# Altium schematic symbol library jlcpcb_2025_04_resistors_extended_0201.schlib: 1508 symbols (part 3 of 8) (continued)
## NQ01WMF3300TEE
designator R?  Resistance: 330Ω  (hidden comment: *)
Resistor, 330Ω, ±1%, 50mW, ±200ppm/℃, SMD 0201; Manufacturer: Uniroyal; Manufacturer Part Number: NQ01WMF3300TEE; Supplier 1: LCSC; Supplier Part Number 1: C965372; JLCPCB Part Number: C965372; Power Rating: 50mW; Category: Resistors; Package Size: 0201; JLCPCB Basic Part: Yes; Tolerance: ±1%; Temperature Coefficient: ±200ppm/℃; ComponentLink1Description: Datasheet; ComponentLink1URL: https://wmsc.lcsc.com/wmsc/upload/file/pdf/v2/lcsc/2304140030_UNI-ROYAL-Uniroyal-Elec-NQ01WMF3300TEE_C965372.pdf; ComponentLink2Description: JLCPCB Part URL; ComponentLink2URL: https://jlcpcb.com/partdetail/C965372
pins: 1, 2
1 alternate drawing of the same symbol

## NQ01WMF3301TEE
designator R?  Resistance: 3.3kΩ  (hidden comment: *)
Resistor, 3.3kΩ, ±1%, 50mW, 50V, ±200ppm/℃, -55℃~+155℃, SMD 0201; Manufacturer: Uniroyal; Manufacturer Part Number: NQ01WMF3301TEE; Supplier 1: LCSC; Supplier Part Number 1: C965371; JLCPCB Part Number: C965371; Power Rating: 50mW; Category: Resistors; Package Size: 0201; JLCPCB Basic Part: Yes; Tolerance: ±1%; Voltage Rating: 50V; Temperature Coefficient: ±200ppm/℃; Temperature Rating: -55℃~+155℃; ComponentLink1Description: Datasheet; ComponentLink1URL: https://wmsc.lcsc.com/wmsc/upload/file/pdf/v2/lcsc/2304140030_UNI-ROYAL-Uniroyal-Elec-NQ01WMF3301TEE_C965371.pdf; ComponentLink2Description: JLCPCB Part URL; ComponentLink2URL: https://jlcpcb.com/partdetail/C965371
pins: 1, 2
1 alternate drawing of the same symbol

## NQ01WMF3401TEE
designator R?  Resistance: 3.4kΩ  (hidden comment: *)
Resistor, 3.4kΩ, ±1%, 50mW, 50V, ±200ppm/℃, -55℃~+155℃, SMD 0201; Manufacturer: Uniroyal; Manufacturer Part Number: NQ01WMF3401TEE; Supplier 1: LCSC; Supplier Part Number 1: C965370; JLCPCB Part Number: C965370; Power Rating: 50mW; Category: Resistors; Package Size: 0201; JLCPCB Basic Part: Yes; Tolerance: ±1%; Voltage Rating: 50V; Temperature Coefficient: ±200ppm/℃; Temperature Rating: -55℃~+155℃; ComponentLink1Description: Datasheet; ComponentLink1URL: https://wmsc.lcsc.com/wmsc/upload/file/pdf/v2/lcsc/2304140030_UNI-ROYAL-Uniroyal-Elec-NQ01WMF3401TEE_C965370.pdf; ComponentLink2Description: JLCPCB Part URL; ComponentLink2URL: https://jlcpcb.com/partdetail/C965370
pins: 1, 2
1 alternate drawing of the same symbol

## NQ01WMF3601TEE
designator R?  Resistance: 3.6kΩ  (hidden comment: *)
Resistor, 3.6kΩ, ±1%, 50mW, ±200ppm/℃, SMD 0201; Manufacturer: Uniroyal; Manufacturer Part Number: NQ01WMF3601TEE; Supplier 1: LCSC; Supplier Part Number 1: C965369; JLCPCB Part Number: C965369; Power Rating: 50mW; Category: Resistors; Package Size: 0201; JLCPCB Basic Part: Yes; Tolerance: ±1%; Temperature Coefficient: ±200ppm/℃; ComponentLink1Description: Datasheet; ComponentLink1URL: https://wmsc.lcsc.com/wmsc/upload/file/pdf/v2/lcsc/2304140030_UNI-ROYAL-Uniroyal-Elec-NQ01WMF3601TEE_C965369.pdf; ComponentLink2Description: JLCPCB Part URL; ComponentLink2URL: https://jlcpcb.com/partdetail/C965369
pins: 1, 2
1 alternate drawing of the same symbol

## NQ01WMF4021TEE
designator R?  Resistance: 4.02kΩ  (hidden comment: *)
Resistor, 4.02kΩ, ±1%, 50mW, ±200ppm/℃, SMD 0201; Manufacturer: Uniroyal; Manufacturer Part Number: NQ01WMF4021TEE; Supplier 1: LCSC; Supplier Part Number 1: C965365; JLCPCB Part Number: C965365; Power Rating: 50mW; Category: Resistors; Package Size: 0201; JLCPCB Basic Part: Yes; Tolerance: ±1%; Temperature Coefficient: ±200ppm/℃; ComponentLink1Description: Datasheet; ComponentLink1URL: https://wmsc.lcsc.com/wmsc/upload/file/pdf/v2/lcsc/2304140030_UNI-ROYAL-Uniroyal-Elec-NQ01WMF4021TEE_C965365.pdf; ComponentLink2Description: JLCPCB Part URL; ComponentLink2URL: https://jlcpcb.com/partdetail/C965365
pins: 1, 2
1 alternate drawing of the same symbol

## NQ01WMF4992TEE
designator R?  Resistance: 49.9kΩ  (hidden comment: *)
Resistor, 49.9kΩ, ±1%, 50mW, 50V, -55℃~+155℃, SMD 0201; Manufacturer: Uniroyal; Manufacturer Part Number: NQ01WMF4992TEE; Supplier 1: LCSC; Supplier Part Number 1: C2758764; JLCPCB Part Number: C2758764; Power Rating: 50mW; Category: Resistors; Package Size: 0201; JLCPCB Basic Part: Yes; Tolerance: ±1%; Voltage Rating: 50V; Temperature Rating: -55℃~+155℃; ComponentLink1Description: Datasheet; ComponentLink1URL: https://wmsc.lcsc.com/wmsc/upload/file/pdf/v2/lcsc/2304140030_UNI-ROYAL-Uniroyal-Elec-NQ01WMF4992TEE_C2758764.pdf; ComponentLink2Description: JLCPCB Part URL; ComponentLink2URL: https://jlcpcb.com/partdetail/C2758764
pins: 1, 2
1 alternate drawing of the same symbol

## NQ01WMF4993TEE
designator R?  Resistance: 499kΩ  (hidden comment: *)
Resistor, 499kΩ, ±1%, 50mW, ±200ppm/℃, SMD 0201; Manufacturer: Uniroyal; Manufacturer Part Number: NQ01WMF4993TEE; Supplier 1: LCSC; Supplier Part Number 1: C965359; JLCPCB Part Number: C965359; Power Rating: 50mW; Category: Resistors; Package Size: 0201; JLCPCB Basic Part: Yes; Tolerance: ±1%; Temperature Coefficient: ±200ppm/℃; ComponentLink1Description: Datasheet; ComponentLink1URL: https://wmsc.lcsc.com/wmsc/upload/file/pdf/v2/lcsc/2304140030_UNI-ROYAL-Uniroyal-Elec-NQ01WMF4993TEE_C965359.pdf; ComponentLink2Description: JLCPCB Part URL; ComponentLink2URL: https://jlcpcb.com/partdetail/C965359
pins: 1, 2
1 alternate drawing of the same symbol

## NQ01WMF5100TEE
designator R?  Resistance: 510Ω  (hidden comment: *)
Resistor, 510Ω, ±1%, 50mW, ±200ppm/℃, SMD 0201; Manufacturer: Uniroyal; Manufacturer Part Number: NQ01WMF5100TEE; Supplier 1: LCSC; Supplier Part Number 1: C965358; JLCPCB Part Number: C965358; Power Rating: 50mW; Category: Resistors; Package Size: 0201; JLCPCB Basic Part: Yes; Tolerance: ±1%; Temperature Coefficient: ±200ppm/℃; ComponentLink1Description: Datasheet; ComponentLink1URL: https://wmsc.lcsc.com/wmsc/upload/file/pdf/v2/lcsc/2304140030_UNI-ROYAL-Uniroyal-Elec-NQ01WMF5100TEE_C965358.pdf; ComponentLink2Description: JLCPCB Part URL; ComponentLink2URL: https://jlcpcb.com/partdetail/C965358
pins: 1, 2
1 alternate drawing of the same symbol

## NQ01WMJ030JTEE
designator R?  Resistance: 3Ω  (hidden comment: *)
Resistor, 3Ω, ±5%, 50mW, -100ppm/℃~+350ppm/℃, SMD 0201; Manufacturer: Uniroyal; Manufacturer Part Number: NQ01WMJ030JTEE; Supplier 1: LCSC; Supplier Part Number 1: C965319; JLCPCB Part Number: C965319; Power Rating: 50mW; Category: Resistors; Package Size: 0201; JLCPCB Basic Part: Yes; Tolerance: ±5%; Temperature Coefficient: -100ppm/℃~+350ppm/℃; ComponentLink1Description: Datasheet; ComponentLink1URL: https://wmsc.lcsc.com/wmsc/upload/file/pdf/v2/lcsc/2304140030_UNI-ROYAL-Uniroyal-Elec-NQ01WMJ030JTEE_C965319.pdf; ComponentLink2Description: JLCPCB Part URL; ComponentLink2URL: https://jlcpcb.com/partdetail/C965319
pins: 1, 2
1 alternate drawing of the same symbol

## NQ01WMJ0104TEE
designator R?  Resistance: 100kΩ  (hidden comment: *)
Resistor, 100kΩ, ±5%, 50mW, ±200ppm/℃, SMD 0201; Manufacturer: Uniroyal; Manufacturer Part Number: NQ01WMJ0104TEE; Supplier 1: LCSC; Supplier Part Number 1: C965343; JLCPCB Part Number: C965343; Power Rating: 50mW; Category: Resistors; Package Size: 0201; JLCPCB Basic Part: Yes; Tolerance: ±5%; Temperature Coefficient: ±200ppm/℃; ComponentLink1Description: Datasheet; ComponentLink1URL: https://wmsc.lcsc.com/wmsc/upload/file/pdf/v2/lcsc/2304140030_UNI-ROYAL-Uniroyal-Elec-NQ01WMJ0104TEE_C965343.pdf; ComponentLink2Description: JLCPCB Part URL; ComponentLink2URL: https://jlcpcb.com/partdetail/C965343
pins: 1, 2
1 alternate drawing of the same symbol

## NQ01WMJ0203TEE
designator R?  Resistance: 20000Ω  (hidden comment: *)
Resistor, 20000Ω, ±5%, 50mW, 50V, ±200ppm/℃, -55℃~+155℃, SMD 0201; Manufacturer: Uniroyal; Manufacturer Part Number: NQ01WMJ0203TEE; Supplier 1: LCSC; Supplier Part Number 1: C965332; JLCPCB Part Number: C965332; Power Rating: 50mW; Category: Resistors; Package Size: 0201; JLCPCB Basic Part: Yes; Tolerance: ±5%; Voltage Rating: 50V; Temperature Coefficient: ±200ppm/℃; Temperature Rating: -55℃~+155℃; ComponentLink1Description: Datasheet; ComponentLink1URL: https://wmsc.lcsc.com/wmsc/upload/file/pdf/v2/lcsc/2304140030_UNI-ROYAL-Uniroyal-Elec-NQ01WMJ0203TEE_C965332.pdf; ComponentLink2Description: JLCPCB Part URL; ComponentLink2URL: https://jlcpcb.com/partdetail/C965332
pins: 1, 2
1 alternate drawing of the same symbol

## NQ01WMJ0274TEE
designator R?  Resistance: 270kΩ  (hidden comment: *)
Resistor, 270kΩ, ±5%, 50mW, ±200ppm/℃, SMD 0201; Manufacturer: Uniroyal; Manufacturer Part Number: NQ01WMJ0274TEE; Supplier 1: LCSC; Supplier Part Number 1: C965325; JLCPCB Part Number: C965325; Power Rating: 50mW; Category: Resistors; Package Size: 0201; JLCPCB Basic Part: Yes; Tolerance: ±5%; Temperature Coefficient: ±200ppm/℃; ComponentLink1Description: Datasheet; ComponentLink1URL: https://wmsc.lcsc.com/wmsc/upload/file/pdf/v2/lcsc/2304140030_UNI-ROYAL-Uniroyal-Elec-NQ01WMJ0274TEE_C965325.pdf; ComponentLink2Description: JLCPCB Part URL; ComponentLink2URL: https://jlcpcb.com/partdetail/C965325
pins: 1, 2
1 alternate drawing of the same symbol

## NQ01WMJ0300TEE
designator R?  Resistance: 30Ω  (hidden comment: *)
Resistor, 30Ω, ±5%, 50mW, 50V, ±200ppm/℃, -55℃~+155℃, SMD 0201; Manufacturer: Uniroyal; Manufacturer Part Number: NQ01WMJ0300TEE; Supplier 1: LCSC; Supplier Part Number 1: C778391; JLCPCB Part Number: C778391; Power Rating: 50mW; Category: Resistors; Package Size: 0201; JLCPCB Basic Part: Yes; Tolerance: ±5%; Voltage Rating: 50V; Temperature Coefficient: ±200ppm/℃; Temperature Rating: -55℃~+155℃; ComponentLink1Description: Datasheet; ComponentLink1URL: https://wmsc.lcsc.com/wmsc/upload/file/pdf/v2/lcsc/2304140030_UNI-ROYAL-Uniroyal-Elec-NQ01WMJ0300TEE_C778391.pdf; ComponentLink2Description: JLCPCB Part URL; ComponentLink2URL: https://jlcpcb.com/partdetail/C778391
pins: 1, 2
1 alternate drawing of the same symbol

## NQ01WMJ0301TEE
designator R?  Resistance: 300Ω  (hidden comment: *)
Resistor, 300Ω, ±5%, 50mW, 50V, ±200ppm/℃, -55℃~+155℃, SMD 0201; Manufacturer: Uniroyal; Manufacturer Part Number: NQ01WMJ0301TEE; Supplier 1: LCSC; Supplier Part Number 1: C965322; JLCPCB Part Number: C965322; Power Rating: 50mW; Category: Resistors; Package Size: 0201; JLCPCB Basic Part: Yes; Tolerance: ±5%; Voltage Rating: 50V; Temperature Coefficient: ±200ppm/℃; Temperature Rating: -55℃~+155℃; ComponentLink1Description: Datasheet; ComponentLink1URL: https://wmsc.lcsc.com/wmsc/upload/file/pdf/v2/lcsc/2304140030_UNI-ROYAL-Uniroyal-Elec-NQ01WMJ0301TEE_C965322.pdf; ComponentLink2Description: JLCPCB Part URL; ComponentLink2URL: https://jlcpcb.com/partdetail/C965322
pins: 1, 2
1 alternate drawing of the same symbol

## NQ01WMJ0304TEE
designator R?  Resistance: 300000Ω  (hidden comment: *)
Resistor, 300000Ω, ±5%, 50mW, 50V, ±200ppm/℃, -55℃~+155℃, SMD 0201; Manufacturer: Uniroyal; Manufacturer Part Number: NQ01WMJ0304TEE; Supplier 1: LCSC; Supplier Part Number 1: C965320; JLCPCB Part Number: C965320; Power Rating: 50mW; Category: Resistors; Package Size: 0201; JLCPCB Basic Part: Yes; Tolerance: ±5%; Voltage Rating: 50V; Temperature Coefficient: ±200ppm/℃; Temperature Rating: -55℃~+155℃; ComponentLink1Description: Datasheet; ComponentLink1URL: https://wmsc.lcsc.com/wmsc/upload/file/pdf/v2/lcsc/2304140030_UNI-ROYAL-Uniroyal-Elec-NQ01WMJ0304TEE_C965320.pdf; ComponentLink2Description: JLCPCB Part URL; ComponentLink2URL: https://jlcpcb.com/partdetail/C965320
pins: 1, 2
1 alternate drawing of the same symbol

## NQ01WMJ0332TEE
designator R?  Resistance: 3.3kΩ  (hidden comment: *)
Resistor, 3.3kΩ, ±5%, 50mW, ±200ppm/℃, SMD 0201; Manufacturer: Uniroyal; Manufacturer Part Number: NQ01WMJ0332TEE; Supplier 1: LCSC; Supplier Part Number 1: C965317; JLCPCB Part Number: C965317; Power Rating: 50mW; Category: Resistors; Package Size: 0201; JLCPCB Basic Part: Yes; Tolerance: ±5%; Temperature Coefficient: ±200ppm/℃; ComponentLink1Description: Datasheet; ComponentLink1URL: https://wmsc.lcsc.com/wmsc/upload/file/pdf/v2/lcsc/2304140030_UNI-ROYAL-Uniroyal-Elec-NQ01WMJ0332TEE_C965317.pdf; ComponentLink2Description: JLCPCB Part URL; ComponentLink2URL: https://jlcpcb.com/partdetail/C965317
pins: 1, 2
1 alternate drawing of the same symbol

## NQ01WMJ0392TEE
designator R?  Resistance: 3.9kΩ  (hidden comment: *)
Resistor, 3.9kΩ, ±5%, 50mW, 50V, ±200ppm/℃, -55℃~+155℃, SMD 0201; Manufacturer: Uniroyal; Manufacturer Part Number: NQ01WMJ0392TEE; Supplier 1: LCSC; Supplier Part Number 1: C965314; JLCPCB Part Number: C965314; Power Rating: 50mW; Category: Resistors; Package Size: 0201; JLCPCB Basic Part: Yes; Tolerance: ±5%; Voltage Rating: 50V; Temperature Coefficient: ±200ppm/℃; Temperature Rating: -55℃~+155℃; ComponentLink1Description: Datasheet; ComponentLink1URL: https://wmsc.lcsc.com/wmsc/upload/file/pdf/v2/lcsc/2304140030_UNI-ROYAL-Uniroyal-Elec-NQ01WMJ0392TEE_C965314.pdf; ComponentLink2Description: JLCPCB Part URL; ComponentLink2URL: https://jlcpcb.com/partdetail/C965314
pins: 1, 2
1 alternate drawing of the same symbol

## NQ01WMJ0470TEE
designator R?  Resistance: 47Ω  (hidden comment: *)
Resistor, 47Ω, ±5%, 50mW, 50V, ±200ppm/℃, -55℃~+155℃, SMD 0201; Manufacturer: Uniroyal; Manufacturer Part Number: NQ01WMJ0470TEE; Supplier 1: LCSC; Supplier Part Number 1: C778405; JLCPCB Part Number: C778405; Power Rating: 50mW; Category: Resistors; Package Size: 0201; JLCPCB Basic Part: Yes; Tolerance: ±5%; Voltage Rating: 50V; Temperature Coefficient: ±200ppm/℃; Temperature Rating: -55℃~+155℃; ComponentLink1Description: Datasheet; ComponentLink1URL: https://wmsc.lcsc.com/wmsc/upload/file/pdf/v2/lcsc/2304140030_UNI-ROYAL-Uniroyal-Elec-NQ01WMJ0470TEE_C778405.pdf; ComponentLink2Description: JLCPCB Part URL; ComponentLink2URL: https://jlcpcb.com/partdetail/C778405
pins: 1, 2
1 alternate drawing of the same symbol

## NQ01WMJ0471TEE
designator R?  Resistance: 470Ω  (hidden comment: *)
Resistor, 470Ω, ±5%, 50mW, ±200ppm/℃, SMD 0201; Manufacturer: Uniroyal; Manufacturer Part Number: NQ01WMJ0471TEE; Supplier 1: LCSC; Supplier Part Number 1: C965312; JLCPCB Part Number: C965312; Power Rating: 50mW; Category: Resistors; Package Size: 0201; JLCPCB Basic Part: Yes; Tolerance: ±5%; Temperature Coefficient: ±200ppm/℃; ComponentLink1Description: Datasheet; ComponentLink1URL: https://wmsc.lcsc.com/wmsc/upload/file/pdf/v2/lcsc/2304140030_UNI-ROYAL-Uniroyal-Elec-NQ01WMJ0471TEE_C965312.pdf; ComponentLink2Description: JLCPCB Part URL; ComponentLink2URL: https://jlcpcb.com/partdetail/C965312
pins: 1, 2
1 alternate drawing of the same symbol

## NQ01WMJ0510TEE
designator R?  Resistance: 51Ω  (hidden comment: *)
Resistor, 51Ω, ±5%, 50mW, 50V, -55℃~+155℃, SMD 0201; Manufacturer: Uniroyal; Manufacturer Part Number: NQ01WMJ0510TEE; Supplier 1: LCSC; Supplier Part Number 1: C965308; JLCPCB Part Number: C965308; Power Rating: 50mW; Category: Resistors; Package Size: 0201; JLCPCB Basic Part: Yes; Tolerance: ±5%; Voltage Rating: 50V; Temperature Rating: -55℃~+155℃; ComponentLink1Description: Datasheet; ComponentLink1URL: https://wmsc.lcsc.com/wmsc/upload/file/pdf/v2/lcsc/2304140030_UNI-ROYAL-Uniroyal-Elec-NQ01WMJ0510TEE_C965308.pdf; ComponentLink2Description: JLCPCB Part URL; ComponentLink2URL: https://jlcpcb.com/partdetail/C965308
pins: 1, 2
1 alternate drawing of the same symbol

## NQ01WMJ0511TEE
designator R?  Resistance: 510Ω  (hidden comment: *)
Resistor, 510Ω, ±5%, 50mW, ±200ppm/℃, SMD 0201; Manufacturer: Uniroyal; Manufacturer Part Number: NQ01WMJ0511TEE; Supplier 1: LCSC; Supplier Part Number 1: C965307; JLCPCB Part Number: C965307; Power Rating: 50mW; Category: Resistors; Package Size: 0201; JLCPCB Basic Part: Yes; Tolerance: ±5%; Temperature Coefficient: ±200ppm/℃; ComponentLink1Description: Datasheet; ComponentLink1URL: https://wmsc.lcsc.com/wmsc/upload/file/pdf/v2/lcsc/2304140030_UNI-ROYAL-Uniroyal-Elec-NQ01WMJ0511TEE_C965307.pdf; ComponentLink2Description: JLCPCB Part URL; ComponentLink2URL: https://jlcpcb.com/partdetail/C965307
pins: 1, 2
1 alternate drawing of the same symbol

## NQ01WMJ0820TEE
designator R?  Resistance: 82Ω  (hidden comment: *)
Resistor, 82Ω, ±5%, 50mW, 50V, ±200ppm/℃, -55℃~+155℃, SMD 0201; Manufacturer: Uniroyal; Manufacturer Part Number: NQ01WMJ0820TEE; Supplier 1: LCSC; Supplier Part Number 1: C965301; JLCPCB Part Number: C965301; Power Rating: 50mW; Category: Resistors; Package Size: 0201; JLCPCB Basic Part: Yes; Tolerance: ±5%; Voltage Rating: 50V; Temperature Coefficient: ±200ppm/℃; Temperature Rating: -55℃~+155℃; ComponentLink1Description: Datasheet; ComponentLink1URL: https://wmsc.lcsc.com/wmsc/upload/file/pdf/v2/lcsc/2304140030_UNI-ROYAL-Uniroyal-Elec-NQ01WMJ0820TEE_C965301.pdf; ComponentLink2Description: JLCPCB Part URL; ComponentLink2URL: https://jlcpcb.com/partdetail/C965301
pins: 1, 2
1 alternate drawing of the same symbol

## PE0201FRF7W0R51L
designator R?  Resistance: 510mΩ  (hidden comment: *)
Resistor, 510mΩ, ±1%, 100mW, ±100ppm/℃, SMD 0201; Manufacturer: Uniroyal; Manufacturer Part Number: PE0201FRF7W0R51L; Supplier 1: LCSC; Supplier Part Number 1: C4204644; JLCPCB Part Number: C4204644; Power Rating: 100mW; Category: Resistors; Package Size: 0201; JLCPCB Basic Part: Yes; Tolerance: ±1%; Temperature Coefficient: ±100ppm/℃; ComponentLink1Description: Datasheet; ComponentLink1URL: https://wmsc.lcsc.com/wmsc/upload/file/pdf/v2/lcsc/2311232009_YAGEO-PE0201FRF7W0R51L_C4204644.pdf; ComponentLink2Description: JLCPCB Part URL; ComponentLink2URL: https://jlcpcb.com/partdetail/C4204644
pins: 1, 2
1 alternate drawing of the same symbol

## PE0201FRF070R1L
designator R?  Resistance: 100mΩ  (hidden comment: *)
Resistor, 100mΩ, ±1%, 50mW, ±100ppm/℃, -55℃~+125℃, SMD 0201; Manufacturer: Uniroyal; Manufacturer Part Number: PE0201FRF070R1L; Supplier 1: LCSC; Supplier Part Number 1: C2089436; JLCPCB Part Number: C2089436; Power Rating: 50mW; Category: Resistors; Package Size: 0201; JLCPCB Basic Part: Yes; Tolerance: ±1%; Temperature Coefficient: ±100ppm/℃; Temperature Rating: -55℃~+125℃; ComponentLink1Description: Datasheet; ComponentLink1URL: https://wmsc.lcsc.com/wmsc/upload/file/pdf/v2/lcsc/2311211101_YAGEO-PE0201FRF070R1L_C2089436.pdf; ComponentLink2Description: JLCPCB Part URL; ComponentLink2URL: https://jlcpcb.com/partdetail/C2089436
pins: 1, 2
1 alternate drawing of the same symbol

## RC0201DR-071K1L
designator R?  Resistance: 1.1kΩ  (hidden comment: *)
Resistor, 1.1kΩ, ±0.5%, 50mW, ±200ppm/℃, -55℃~+125℃, SMD 0201; Manufacturer: Uniroyal; Manufacturer Part Number: RC0201DR-071K1L; Supplier 1: LCSC; Supplier Part Number 1: C851665; JLCPCB Part Number: C851665; Power Rating: 50mW; Category: Resistors; Package Size: 0201; JLCPCB Basic Part: Yes; Tolerance: ±0.5%; Temperature Coefficient: ±200ppm/℃; Temperature Rating: -55℃~+125℃; ComponentLink1Description: Datasheet; ComponentLink1URL: https://wmsc.lcsc.com/wmsc/upload/file/pdf/v2/lcsc/2210190401_YAGEO-RC0201DR-071K1L_C851665.pdf; ComponentLink2Description: JLCPCB Part URL; ComponentLink2URL: https://jlcpcb.com/partdetail/C851665
pins: 1, 2
1 alternate drawing of the same symbol

## RC0201DR-071K2L
designator R?  Resistance: 1.2kΩ  (hidden comment: *)
Resistor, 1.2kΩ, ±0.5%, 50mW, ±200ppm/℃, -55℃~+125℃, SMD 0201; Manufacturer: Uniroyal; Manufacturer Part Number: RC0201DR-071K2L; Supplier 1: LCSC; Supplier Part Number 1: C851668; JLCPCB Part Number: C851668; Power Rating: 50mW; Category: Resistors; Package Size: 0201; JLCPCB Basic Part: Yes; Tolerance: ±0.5%; Temperature Coefficient: ±200ppm/℃; Temperature Rating: -55℃~+125℃; ComponentLink1Description: Datasheet; ComponentLink1URL: https://wmsc.lcsc.com/wmsc/upload/file/pdf/v2/lcsc/2210190401_YAGEO-RC0201DR-071K2L_C851668.pdf; ComponentLink2Description: JLCPCB Part URL; ComponentLink2URL: https://jlcpcb.com/partdetail/C851668
pins: 1, 2
1 alternate drawing of the same symbol

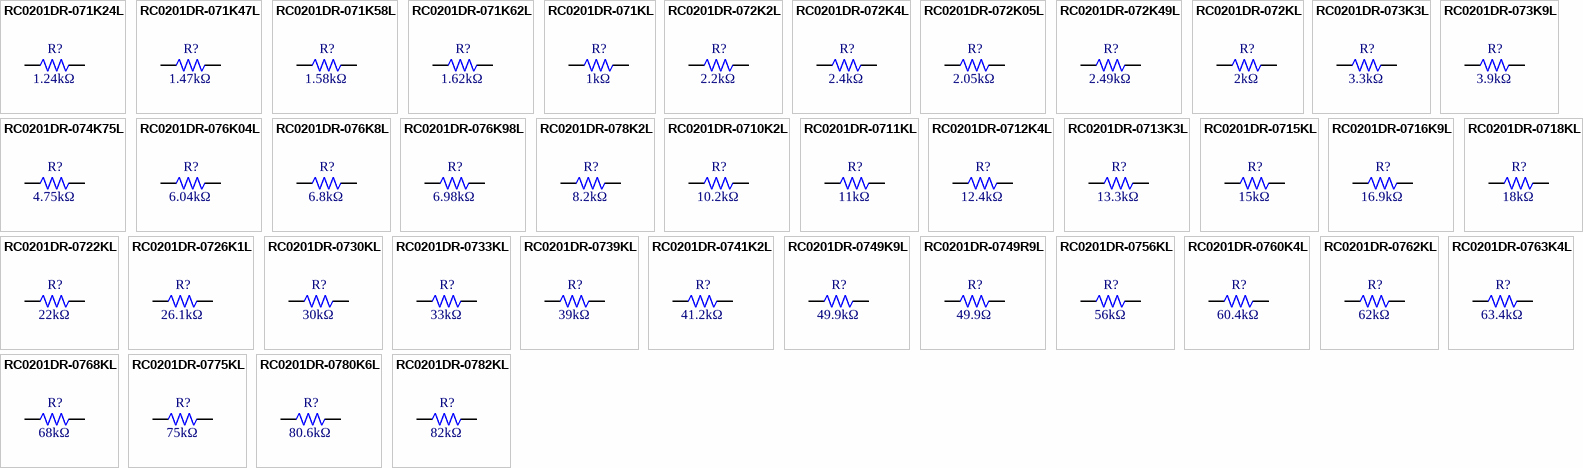
[diagram p14: symbols RC0201DR-071K24L to RC0201DR-0782KL]

## RC0201DR-071K24L
designator R?  Resistance: 1.24kΩ  (hidden comment: *)
Resistor, 1.24kΩ, ±0.5%, 50mW, ±200ppm/℃, -55℃~+125℃, SMD 0201; Manufacturer: Uniroyal; Manufacturer Part Number: RC0201DR-071K24L; Supplier 1: LCSC; Supplier Part Number 1: C851666; JLCPCB Part Number: C851666; Power Rating: 50mW; Category: Resistors; Package Size: 0201; JLCPCB Basic Part: Yes; Tolerance: ±0.5%; Temperature Coefficient: ±200ppm/℃; Temperature Rating: -55℃~+125℃; ComponentLink1Description: Datasheet; ComponentLink1URL: https://wmsc.lcsc.com/wmsc/upload/file/pdf/v2/lcsc/2210190401_YAGEO-RC0201DR-071K24L_C851666.pdf; ComponentLink2Description: JLCPCB Part URL; ComponentLink2URL: https://jlcpcb.com/partdetail/C851666
pins: 1, 2
1 alternate drawing of the same symbol

## RC0201DR-071K47L
designator R?  Resistance: 1.47kΩ  (hidden comment: *)
Resistor, 1.47kΩ, ±0.5%, 50mW, ±200ppm/℃, -55℃~+125℃, SMD 0201; Manufacturer: Uniroyal; Manufacturer Part Number: RC0201DR-071K47L; Supplier 1: LCSC; Supplier Part Number 1: C851670; JLCPCB Part Number: C851670; Power Rating: 50mW; Category: Resistors; Package Size: 0201; JLCPCB Basic Part: Yes; Tolerance: ±0.5%; Temperature Coefficient: ±200ppm/℃; Temperature Rating: -55℃~+125℃; ComponentLink1Description: Datasheet; ComponentLink1URL: https://wmsc.lcsc.com/wmsc/upload/file/pdf/v2/lcsc/2210190401_YAGEO-RC0201DR-071K47L_C851670.pdf; ComponentLink2Description: JLCPCB Part URL; ComponentLink2URL: https://jlcpcb.com/partdetail/C851670
pins: 1, 2
1 alternate drawing of the same symbol

## RC0201DR-071K58L
designator R?  Resistance: 1.58kΩ  (hidden comment: *)
Resistor, 1.58kΩ, ±0.5%, 50mW, ±200ppm/℃, -55℃~+125℃, SMD 0201; Manufacturer: Uniroyal; Manufacturer Part Number: RC0201DR-071K58L; Supplier 1: LCSC; Supplier Part Number 1: C851671; JLCPCB Part Number: C851671; Power Rating: 50mW; Category: Resistors; Package Size: 0201; JLCPCB Basic Part: Yes; Tolerance: ±0.5%; Temperature Coefficient: ±200ppm/℃; Temperature Rating: -55℃~+125℃; ComponentLink1Description: Datasheet; ComponentLink1URL: https://wmsc.lcsc.com/wmsc/upload/file/pdf/v2/lcsc/2311211101_YAGEO-RC0201DR-071K58L_C851671.pdf; ComponentLink2Description: JLCPCB Part URL; ComponentLink2URL: https://jlcpcb.com/partdetail/C851671
pins: 1, 2
1 alternate drawing of the same symbol

## RC0201DR-071K62L
designator R?  Resistance: 1.62kΩ  (hidden comment: *)
Resistor, 1.62kΩ, ±0.5%, 50mW, ±200ppm/℃, -55℃~+125℃, SMD 0201; Manufacturer: Uniroyal; Manufacturer Part Number: RC0201DR-071K62L; Supplier 1: LCSC; Supplier Part Number 1: C851673; JLCPCB Part Number: C851673; Power Rating: 50mW; Category: Resistors; Package Size: 0201; JLCPCB Basic Part: Yes; Tolerance: ±0.5%; Temperature Coefficient: ±200ppm/℃; Temperature Rating: -55℃~+125℃; ComponentLink1Description: Datasheet; ComponentLink1URL: https://wmsc.lcsc.com/wmsc/upload/file/pdf/v2/lcsc/2210190401_YAGEO-RC0201DR-071K62L_C851673.pdf; ComponentLink2Description: JLCPCB Part URL; ComponentLink2URL: https://jlcpcb.com/partdetail/C851673
pins: 1, 2
1 alternate drawing of the same symbol

## RC0201DR-071KL
designator R?  Resistance: 1kΩ  (hidden comment: *)
Resistor, 1kΩ, ±0.5%, 50mW, ±200ppm/℃, -55℃~+125℃, SMD 0201; Manufacturer: Uniroyal; Manufacturer Part Number: RC0201DR-071KL; Supplier 1: LCSC; Supplier Part Number 1: C851674; JLCPCB Part Number: C851674; Power Rating: 50mW; Category: Resistors; Package Size: 0201; JLCPCB Basic Part: Yes; Tolerance: ±0.5%; Temperature Coefficient: ±200ppm/℃; Temperature Rating: -55℃~+125℃; ComponentLink1Description: Datasheet; ComponentLink1URL: https://wmsc.lcsc.com/wmsc/upload/file/pdf/v2/lcsc/2210190401_YAGEO-RC0201DR-071KL_C851674.pdf; ComponentLink2Description: JLCPCB Part URL; ComponentLink2URL: https://jlcpcb.com/partdetail/C851674
pins: 1, 2
1 alternate drawing of the same symbol

## RC0201DR-072K2L
designator R?  Resistance: 2.2kΩ  (hidden comment: *)
Resistor, 2.2kΩ, ±0.5%, 50mW, 25V, ±200ppm/℃, -55℃~+125℃, SMD 0201; Manufacturer: Uniroyal; Manufacturer Part Number: RC0201DR-072K2L; Supplier 1: LCSC; Supplier Part Number 1: C851700; JLCPCB Part Number: C851700; Power Rating: 50mW; Category: Resistors; Package Size: 0201; JLCPCB Basic Part: Yes; Tolerance: ±0.5%; Voltage Rating: 25V; Temperature Coefficient: ±200ppm/℃; Temperature Rating: -55℃~+125℃; ComponentLink1Description: Datasheet; ComponentLink1URL: https://wmsc.lcsc.com/wmsc/upload/file/pdf/v2/lcsc/2202281730_YAGEO-RC0201DR-072K2L_C851700.pdf; ComponentLink2Description: JLCPCB Part URL; ComponentLink2URL: https://jlcpcb.com/partdetail/C851700
pins: 1, 2
1 alternate drawing of the same symbol

## RC0201DR-072K4L
designator R?  Resistance: 2.4kΩ  (hidden comment: *)
Resistor, 2.4kΩ, ±0.5%, 50mW, ±200ppm/℃, -55℃~+125℃, SMD 0201; Manufacturer: Uniroyal; Manufacturer Part Number: RC0201DR-072K4L; Supplier 1: LCSC; Supplier Part Number 1: C851702; JLCPCB Part Number: C851702; Power Rating: 50mW; Category: Resistors; Package Size: 0201; JLCPCB Basic Part: Yes; Tolerance: ±0.5%; Temperature Coefficient: ±200ppm/℃; Temperature Rating: -55℃~+125℃; ComponentLink1Description: Datasheet; ComponentLink1URL: https://wmsc.lcsc.com/wmsc/upload/file/pdf/v2/lcsc/2206241815_YAGEO-RC0201DR-072K4L_C851702.pdf; ComponentLink2Description: JLCPCB Part URL; ComponentLink2URL: https://jlcpcb.com/partdetail/C851702
pins: 1, 2
1 alternate drawing of the same symbol

## RC0201DR-072K05L
designator R?  Resistance: 2.05kΩ  (hidden comment: *)
Resistor, 2.05kΩ, ±0.5%, 50mW, ±200ppm/℃, -55℃~+125℃, SMD 0201; Manufacturer: Uniroyal; Manufacturer Part Number: RC0201DR-072K05L; Supplier 1: LCSC; Supplier Part Number 1: C851698; JLCPCB Part Number: C851698; Power Rating: 50mW; Category: Resistors; Package Size: 0201; JLCPCB Basic Part: Yes; Tolerance: ±0.5%; Temperature Coefficient: ±200ppm/℃; Temperature Rating: -55℃~+125℃; ComponentLink1Description: Datasheet; ComponentLink1URL: https://wmsc.lcsc.com/wmsc/upload/file/pdf/v2/lcsc/2210190401_YAGEO-RC0201DR-072K05L_C851698.pdf; ComponentLink2Description: JLCPCB Part URL; ComponentLink2URL: https://jlcpcb.com/partdetail/C851698
pins: 1, 2
1 alternate drawing of the same symbol

## RC0201DR-072K49L
designator R?  Resistance: 2.49kΩ  (hidden comment: *)
Resistor, 2.49kΩ, ±0.5%, 50mW, ±200ppm/℃, -55℃~+125℃, SMD 0201; Manufacturer: Uniroyal; Manufacturer Part Number: RC0201DR-072K49L; Supplier 1: LCSC; Supplier Part Number 1: C851701; JLCPCB Part Number: C851701; Power Rating: 50mW; Category: Resistors; Package Size: 0201; JLCPCB Basic Part: Yes; Tolerance: ±0.5%; Temperature Coefficient: ±200ppm/℃; Temperature Rating: -55℃~+125℃; ComponentLink1Description: Datasheet; ComponentLink1URL: https://wmsc.lcsc.com/wmsc/upload/file/pdf/v2/lcsc/2210190401_YAGEO-RC0201DR-072K49L_C851701.pdf; ComponentLink2Description: JLCPCB Part URL; ComponentLink2URL: https://jlcpcb.com/partdetail/C851701
pins: 1, 2
1 alternate drawing of the same symbol

## RC0201DR-072KL
designator R?  Resistance: 2kΩ  (hidden comment: *)
Resistor, 2kΩ, ±0.5%, 50mW, ±200ppm/℃, -55℃~+125℃, SMD 0201; Manufacturer: Uniroyal; Manufacturer Part Number: RC0201DR-072KL; Supplier 1: LCSC; Supplier Part Number 1: C851709; JLCPCB Part Number: C851709; Power Rating: 50mW; Category: Resistors; Package Size: 0201; JLCPCB Basic Part: Yes; Tolerance: ±0.5%; Temperature Coefficient: ±200ppm/℃; Temperature Rating: -55℃~+125℃; ComponentLink1Description: Datasheet; ComponentLink1URL: https://wmsc.lcsc.com/wmsc/upload/file/pdf/v2/lcsc/2206241815_YAGEO-RC0201DR-072KL_C851709.pdf; ComponentLink2Description: JLCPCB Part URL; ComponentLink2URL: https://jlcpcb.com/partdetail/C851709
pins: 1, 2
1 alternate drawing of the same symbol

## RC0201DR-073K3L
designator R?  Resistance: 3.3kΩ  (hidden comment: *)
Resistor, 3.3kΩ, ±0.5%, 50mW, ±200ppm/℃, -55℃~+125℃, SMD 0201; Manufacturer: Uniroyal; Manufacturer Part Number: RC0201DR-073K3L; Supplier 1: LCSC; Supplier Part Number 1: C851731; JLCPCB Part Number: C851731; Power Rating: 50mW; Category: Resistors; Package Size: 0201; JLCPCB Basic Part: Yes; Tolerance: ±0.5%; Temperature Coefficient: ±200ppm/℃; Temperature Rating: -55℃~+125℃; ComponentLink1Description: Datasheet; ComponentLink1URL: https://wmsc.lcsc.com/wmsc/upload/file/pdf/v2/lcsc/2206241815_YAGEO-RC0201DR-073K3L_C851731.pdf; ComponentLink2Description: JLCPCB Part URL; ComponentLink2URL: https://jlcpcb.com/partdetail/C851731
pins: 1, 2
1 alternate drawing of the same symbol

## RC0201DR-073K9L
designator R?  Resistance: 3.9kΩ  (hidden comment: *)
Resistor, 3.9kΩ, ±0.5%, 50mW, ±200ppm/℃, -55℃~+125℃, SMD 0201; Manufacturer: Uniroyal; Manufacturer Part Number: RC0201DR-073K9L; Supplier 1: LCSC; Supplier Part Number 1: C851733; JLCPCB Part Number: C851733; Power Rating: 50mW; Category: Resistors; Package Size: 0201; JLCPCB Basic Part: Yes; Tolerance: ±0.5%; Temperature Coefficient: ±200ppm/℃; Temperature Rating: -55℃~+125℃; ComponentLink1Description: Datasheet; ComponentLink1URL: https://wmsc.lcsc.com/wmsc/upload/file/pdf/v2/lcsc/2210190401_YAGEO-RC0201DR-073K9L_C851733.pdf; ComponentLink2Description: JLCPCB Part URL; ComponentLink2URL: https://jlcpcb.com/partdetail/C851733
pins: 1, 2
1 alternate drawing of the same symbol

## RC0201DR-074K75L
designator R?  Resistance: 4.75kΩ  (hidden comment: *)
Resistor, 4.75kΩ, ±0.5%, 50mW, 15V, ±200ppm/℃, -55℃~+125℃, SMD 0201; Manufacturer: Uniroyal; Manufacturer Part Number: RC0201DR-074K75L; Supplier 1: LCSC; Supplier Part Number 1: C851754; JLCPCB Part Number: C851754; Power Rating: 50mW; Category: Resistors; Package Size: 0201; JLCPCB Basic Part: Yes; Tolerance: ±0.5%; Voltage Rating: 15V; Temperature Coefficient: ±200ppm/℃; Temperature Rating: -55℃~+125℃; ComponentLink1Description: Datasheet; ComponentLink1URL: https://wmsc.lcsc.com/wmsc/upload/file/pdf/v2/lcsc/2201051730_YAGEO-RC0201DR-074K75L_C851754.pdf; ComponentLink2Description: JLCPCB Part URL; ComponentLink2URL: https://jlcpcb.com/partdetail/C851754
pins: 1, 2
1 alternate drawing of the same symbol

## RC0201DR-076K04L
designator R?  Resistance: 6.04kΩ  (hidden comment: *)
Resistor, 6.04kΩ, ±0.5%, 50mW, ±200ppm/℃, -55℃~+125℃, SMD 0201; Manufacturer: Uniroyal; Manufacturer Part Number: RC0201DR-076K04L; Supplier 1: LCSC; Supplier Part Number 1: C851784; JLCPCB Part Number: C851784; Power Rating: 50mW; Category: Resistors; Package Size: 0201; JLCPCB Basic Part: Yes; Tolerance: ±0.5%; Temperature Coefficient: ±200ppm/℃; Temperature Rating: -55℃~+125℃; ComponentLink1Description: Datasheet; ComponentLink1URL: https://wmsc.lcsc.com/wmsc/upload/file/pdf/v2/lcsc/2206241815_YAGEO-RC0201DR-076K04L_C851784.pdf; ComponentLink2Description: JLCPCB Part URL; ComponentLink2URL: https://jlcpcb.com/partdetail/C851784
pins: 1, 2
1 alternate drawing of the same symbol

## RC0201DR-076K8L
designator R?  Resistance: 6.8kΩ  (hidden comment: *)
Resistor, 6.8kΩ, ±0.5%, 50mW, ±200ppm/℃, -55℃~+125℃, SMD 0201; Manufacturer: Uniroyal; Manufacturer Part Number: RC0201DR-076K8L; Supplier 1: LCSC; Supplier Part Number 1: C851789; JLCPCB Part Number: C851789; Power Rating: 50mW; Category: Resistors; Package Size: 0201; JLCPCB Basic Part: Yes; Tolerance: ±0.5%; Temperature Coefficient: ±200ppm/℃; Temperature Rating: -55℃~+125℃; ComponentLink1Description: Datasheet; ComponentLink1URL: https://wmsc.lcsc.com/wmsc/upload/file/pdf/v2/lcsc/2206241815_YAGEO-RC0201DR-076K8L_C851789.pdf; ComponentLink2Description: JLCPCB Part URL; ComponentLink2URL: https://jlcpcb.com/partdetail/C851789
pins: 1, 2
1 alternate drawing of the same symbol

## RC0201DR-076K98L
designator R?  Resistance: 6.98kΩ  (hidden comment: *)
Resistor, 6.98kΩ, ±0.5%, 50mW, ±200ppm/℃, -55℃~+125℃, SMD 0201; Manufacturer: Uniroyal; Manufacturer Part Number: RC0201DR-076K98L; Supplier 1: LCSC; Supplier Part Number 1: C851790; JLCPCB Part Number: C851790; Power Rating: 50mW; Category: Resistors; Package Size: 0201; JLCPCB Basic Part: Yes; Tolerance: ±0.5%; Temperature Coefficient: ±200ppm/℃; Temperature Rating: -55℃~+125℃; ComponentLink1Description: Datasheet; ComponentLink1URL: https://wmsc.lcsc.com/wmsc/upload/file/pdf/v2/lcsc/2210190401_YAGEO-RC0201DR-076K98L_C851790.pdf; ComponentLink2Description: JLCPCB Part URL; ComponentLink2URL: https://jlcpcb.com/partdetail/C851790
pins: 1, 2
1 alternate drawing of the same symbol

## RC0201DR-078K2L
designator R?  Resistance: 8.2kΩ  (hidden comment: *)
Resistor, 8.2kΩ, ±0.5%, 50mW, 25V, ±200ppm/℃, -55℃~+125℃, SMD 0201; Manufacturer: Uniroyal; Manufacturer Part Number: RC0201DR-078K2L; Supplier 1: LCSC; Supplier Part Number 1: C2109663; JLCPCB Part Number: C2109663; Power Rating: 50mW; Category: Resistors; Package Size: 0201; JLCPCB Basic Part: Yes; Tolerance: ±0.5%; Voltage Rating: 25V; Temperature Coefficient: ±200ppm/℃; Temperature Rating: -55℃~+125℃; ComponentLink1Description: Datasheet; ComponentLink1URL: https://wmsc.lcsc.com/wmsc/upload/file/pdf/v2/lcsc/2202081430_YAGEO-RC0201DR-078K2L_C2109663.pdf; ComponentLink2Description: JLCPCB Part URL; ComponentLink2URL: https://jlcpcb.com/partdetail/C2109663
pins: 1, 2
1 alternate drawing of the same symbol

## RC0201DR-0710K2L
designator R?  Resistance: 10.2kΩ  (hidden comment: *)
Resistor, 10.2kΩ, ±0.5%, 50mW, ±200ppm/℃, -55℃~+125℃, SMD 0201; Manufacturer: Uniroyal; Manufacturer Part Number: RC0201DR-0710K2L; Supplier 1: LCSC; Supplier Part Number 1: C851635; JLCPCB Part Number: C851635; Power Rating: 50mW; Category: Resistors; Package Size: 0201; JLCPCB Basic Part: Yes; Tolerance: ±0.5%; Temperature Coefficient: ±200ppm/℃; Temperature Rating: -55℃~+125℃; ComponentLink1Description: Datasheet; ComponentLink1URL: https://wmsc.lcsc.com/wmsc/upload/file/pdf/v2/lcsc/2210190401_YAGEO-RC0201DR-0710K2L_C851635.pdf; ComponentLink2Description: JLCPCB Part URL; ComponentLink2URL: https://jlcpcb.com/partdetail/C851635
pins: 1, 2
1 alternate drawing of the same symbol

## RC0201DR-0711KL
designator R?  Resistance: 11kΩ  (hidden comment: *)
Resistor, 11kΩ, ±0.5%, 50mW, ±200ppm/℃, -55℃~+125℃, SMD 0201; Manufacturer: Uniroyal; Manufacturer Part Number: RC0201DR-0711KL; Supplier 1: LCSC; Supplier Part Number 1: C851642; JLCPCB Part Number: C851642; Power Rating: 50mW; Category: Resistors; Package Size: 0201; JLCPCB Basic Part: Yes; Tolerance: ±0.5%; Temperature Coefficient: ±200ppm/℃; Temperature Rating: -55℃~+125℃; ComponentLink1Description: Datasheet; ComponentLink1URL: https://wmsc.lcsc.com/wmsc/upload/file/pdf/v2/lcsc/2206241815_YAGEO-RC0201DR-0711KL_C851642.pdf; ComponentLink2Description: JLCPCB Part URL; ComponentLink2URL: https://jlcpcb.com/partdetail/C851642
pins: 1, 2
1 alternate drawing of the same symbol

## RC0201DR-0712K4L
designator R?  Resistance: 12.4kΩ  (hidden comment: *)
Resistor, 12.4kΩ, ±0.5%, 50mW, ±200ppm/℃, -55℃~+125℃, SMD 0201; Manufacturer: Uniroyal; Manufacturer Part Number: RC0201DR-0712K4L; Supplier 1: LCSC; Supplier Part Number 1: C851644; JLCPCB Part Number: C851644; Power Rating: 50mW; Category: Resistors; Package Size: 0201; JLCPCB Basic Part: Yes; Tolerance: ±0.5%; Temperature Coefficient: ±200ppm/℃; Temperature Rating: -55℃~+125℃; ComponentLink1Description: Datasheet; ComponentLink1URL: https://wmsc.lcsc.com/wmsc/upload/file/pdf/v2/lcsc/2210190401_YAGEO-RC0201DR-0712K4L_C851644.pdf; ComponentLink2Description: JLCPCB Part URL; ComponentLink2URL: https://jlcpcb.com/partdetail/C851644
pins: 1, 2
1 alternate drawing of the same symbol

## RC0201DR-0713K3L
designator R?  Resistance: 13.3kΩ  (hidden comment: *)
Resistor, 13.3kΩ, ±0.5%, 50mW, ±200ppm/℃, -55℃~+125℃, SMD 0201; Manufacturer: Uniroyal; Manufacturer Part Number: RC0201DR-0713K3L; Supplier 1: LCSC; Supplier Part Number 1: C851649; JLCPCB Part Number: C851649; Power Rating: 50mW; Category: Resistors; Package Size: 0201; JLCPCB Basic Part: Yes; Tolerance: ±0.5%; Temperature Coefficient: ±200ppm/℃; Temperature Rating: -55℃~+125℃; ComponentLink1Description: Datasheet; ComponentLink1URL: https://wmsc.lcsc.com/wmsc/upload/file/pdf/v2/lcsc/2210190401_YAGEO-RC0201DR-0713K3L_C851649.pdf; ComponentLink2Description: JLCPCB Part URL; ComponentLink2URL: https://jlcpcb.com/partdetail/C851649
pins: 1, 2
1 alternate drawing of the same symbol

## RC0201DR-0715KL
designator R?  Resistance: 15kΩ  (hidden comment: *)
Resistor, 15kΩ, ±0.5%, 50mW, ±200ppm/℃, -55℃~+125℃, SMD 0201; Manufacturer: Uniroyal; Manufacturer Part Number: RC0201DR-0715KL; Supplier 1: LCSC; Supplier Part Number 1: C851656; JLCPCB Part Number: C851656; Power Rating: 50mW; Category: Resistors; Package Size: 0201; JLCPCB Basic Part: Yes; Tolerance: ±0.5%; Temperature Coefficient: ±200ppm/℃; Temperature Rating: -55℃~+125℃; ComponentLink1Description: Datasheet; ComponentLink1URL: https://wmsc.lcsc.com/wmsc/upload/file/pdf/v2/lcsc/2206241815_YAGEO-RC0201DR-0715KL_C851656.pdf; ComponentLink2Description: JLCPCB Part URL; ComponentLink2URL: https://jlcpcb.com/partdetail/C851656
pins: 1, 2
1 alternate drawing of the same symbol

## RC0201DR-0716K9L
designator R?  Resistance: 16.9kΩ  (hidden comment: *)
Resistor, 16.9kΩ, ±0.5%, 50mW, ±200ppm/℃, -55℃~+125℃, SMD 0201; Manufacturer: Uniroyal; Manufacturer Part Number: RC0201DR-0716K9L; Supplier 1: LCSC; Supplier Part Number 1: C851658; JLCPCB Part Number: C851658; Power Rating: 50mW; Category: Resistors; Package Size: 0201; JLCPCB Basic Part: Yes; Tolerance: ±0.5%; Temperature Coefficient: ±200ppm/℃; Temperature Rating: -55℃~+125℃; ComponentLink1Description: Datasheet; ComponentLink1URL: https://wmsc.lcsc.com/wmsc/upload/file/pdf/v2/lcsc/2210190401_YAGEO-RC0201DR-0716K9L_C851658.pdf; ComponentLink2Description: JLCPCB Part URL; ComponentLink2URL: https://jlcpcb.com/partdetail/C851658
pins: 1, 2
1 alternate drawing of the same symbol

## RC0201DR-0718KL
designator R?  Resistance: 18kΩ  (hidden comment: *)
Resistor, 18kΩ, ±0.5%, 50mW, ±200ppm/℃, -55℃~+125℃, SMD 0201; Manufacturer: Uniroyal; Manufacturer Part Number: RC0201DR-0718KL; Supplier 1: LCSC; Supplier Part Number 1: C851662; JLCPCB Part Number: C851662; Power Rating: 50mW; Category: Resistors; Package Size: 0201; JLCPCB Basic Part: Yes; Tolerance: ±0.5%; Temperature Coefficient: ±200ppm/℃; Temperature Rating: -55℃~+125℃; ComponentLink1Description: Datasheet; ComponentLink1URL: https://wmsc.lcsc.com/wmsc/upload/file/pdf/v2/lcsc/2210190401_YAGEO-RC0201DR-0718KL_C851662.pdf; ComponentLink2Description: JLCPCB Part URL; ComponentLink2URL: https://jlcpcb.com/partdetail/C851662
pins: 1, 2
1 alternate drawing of the same symbol

## RC0201DR-0722KL
designator R?  Resistance: 22kΩ  (hidden comment: *)
Resistor, 22kΩ, ±0.5%, 50mW, ±200ppm/℃, -55℃~+125℃, SMD 0201; Manufacturer: Uniroyal; Manufacturer Part Number: RC0201DR-0722KL; Supplier 1: LCSC; Supplier Part Number 1: C851684; JLCPCB Part Number: C851684; Power Rating: 50mW; Category: Resistors; Package Size: 0201; JLCPCB Basic Part: Yes; Tolerance: ±0.5%; Temperature Coefficient: ±200ppm/℃; Temperature Rating: -55℃~+125℃; ComponentLink1Description: Datasheet; ComponentLink1URL: https://wmsc.lcsc.com/wmsc/upload/file/pdf/v2/lcsc/2210190401_YAGEO-RC0201DR-0722KL_C851684.pdf; ComponentLink2Description: JLCPCB Part URL; ComponentLink2URL: https://jlcpcb.com/partdetail/C851684
pins: 1, 2
1 alternate drawing of the same symbol

## RC0201DR-0726K1L
designator R?  Resistance: 26.1kΩ  (hidden comment: *)
Resistor, 26.1kΩ, ±0.5%, 50mW, ±200ppm/℃, -55℃~+125℃, SMD 0201; Manufacturer: Uniroyal; Manufacturer Part Number: RC0201DR-0726K1L; Supplier 1: LCSC; Supplier Part Number 1: C851693; JLCPCB Part Number: C851693; Power Rating: 50mW; Category: Resistors; Package Size: 0201; JLCPCB Basic Part: Yes; Tolerance: ±0.5%; Temperature Coefficient: ±200ppm/℃; Temperature Rating: -55℃~+125℃; ComponentLink1Description: Datasheet; ComponentLink1URL: https://wmsc.lcsc.com/wmsc/upload/file/pdf/v2/lcsc/2210190401_YAGEO-RC0201DR-0726K1L_C851693.pdf; ComponentLink2Description: JLCPCB Part URL; ComponentLink2URL: https://jlcpcb.com/partdetail/C851693
pins: 1, 2
1 alternate drawing of the same symbol

## RC0201DR-0730KL
designator R?  Resistance: 30kΩ  (hidden comment: *)
Resistor, 30kΩ, ±0.5%, 50mW, ±200ppm/℃, -55℃~+125℃, SMD 0201; Manufacturer: Uniroyal; Manufacturer Part Number: RC0201DR-0730KL; Supplier 1: LCSC; Supplier Part Number 1: C851713; JLCPCB Part Number: C851713; Power Rating: 50mW; Category: Resistors; Package Size: 0201; JLCPCB Basic Part: Yes; Tolerance: ±0.5%; Temperature Coefficient: ±200ppm/℃; Temperature Rating: -55℃~+125℃; ComponentLink1Description: Datasheet; ComponentLink1URL: https://wmsc.lcsc.com/wmsc/upload/file/pdf/v2/lcsc/2210190401_YAGEO-RC0201DR-0730KL_C851713.pdf; ComponentLink2Description: JLCPCB Part URL; ComponentLink2URL: https://jlcpcb.com/partdetail/C851713
pins: 1, 2
1 alternate drawing of the same symbol

## RC0201DR-0733KL
designator R?  Resistance: 33kΩ  (hidden comment: *)
Resistor, 33kΩ, ±0.5%, 50mW, ±200ppm/℃, -55℃~+125℃, SMD 0201; Manufacturer: Uniroyal; Manufacturer Part Number: RC0201DR-0733KL; Supplier 1: LCSC; Supplier Part Number 1: C851719; JLCPCB Part Number: C851719; Power Rating: 50mW; Category: Resistors; Package Size: 0201; JLCPCB Basic Part: Yes; Tolerance: ±0.5%; Temperature Coefficient: ±200ppm/℃; Temperature Rating: -55℃~+125℃; ComponentLink1Description: Datasheet; ComponentLink1URL: https://wmsc.lcsc.com/wmsc/upload/file/pdf/v2/lcsc/2210190401_YAGEO-RC0201DR-0733KL_C851719.pdf; ComponentLink2Description: JLCPCB Part URL; ComponentLink2URL: https://jlcpcb.com/partdetail/C851719
pins: 1, 2
1 alternate drawing of the same symbol